# Altium footprint library ESKDPcbLib.PcbLib: 608 footprints (part 28 of 38)
Each footprint in its own frame and in the unit in brackets; x right, y up, seen from the top. Pads: shape width x height; smd on the part's side, far side on the other; paste and mask are expansions set on the pad; w line width, h text height; cw(c..) or ccw(c..) is an arc to the next point about the centre after c.
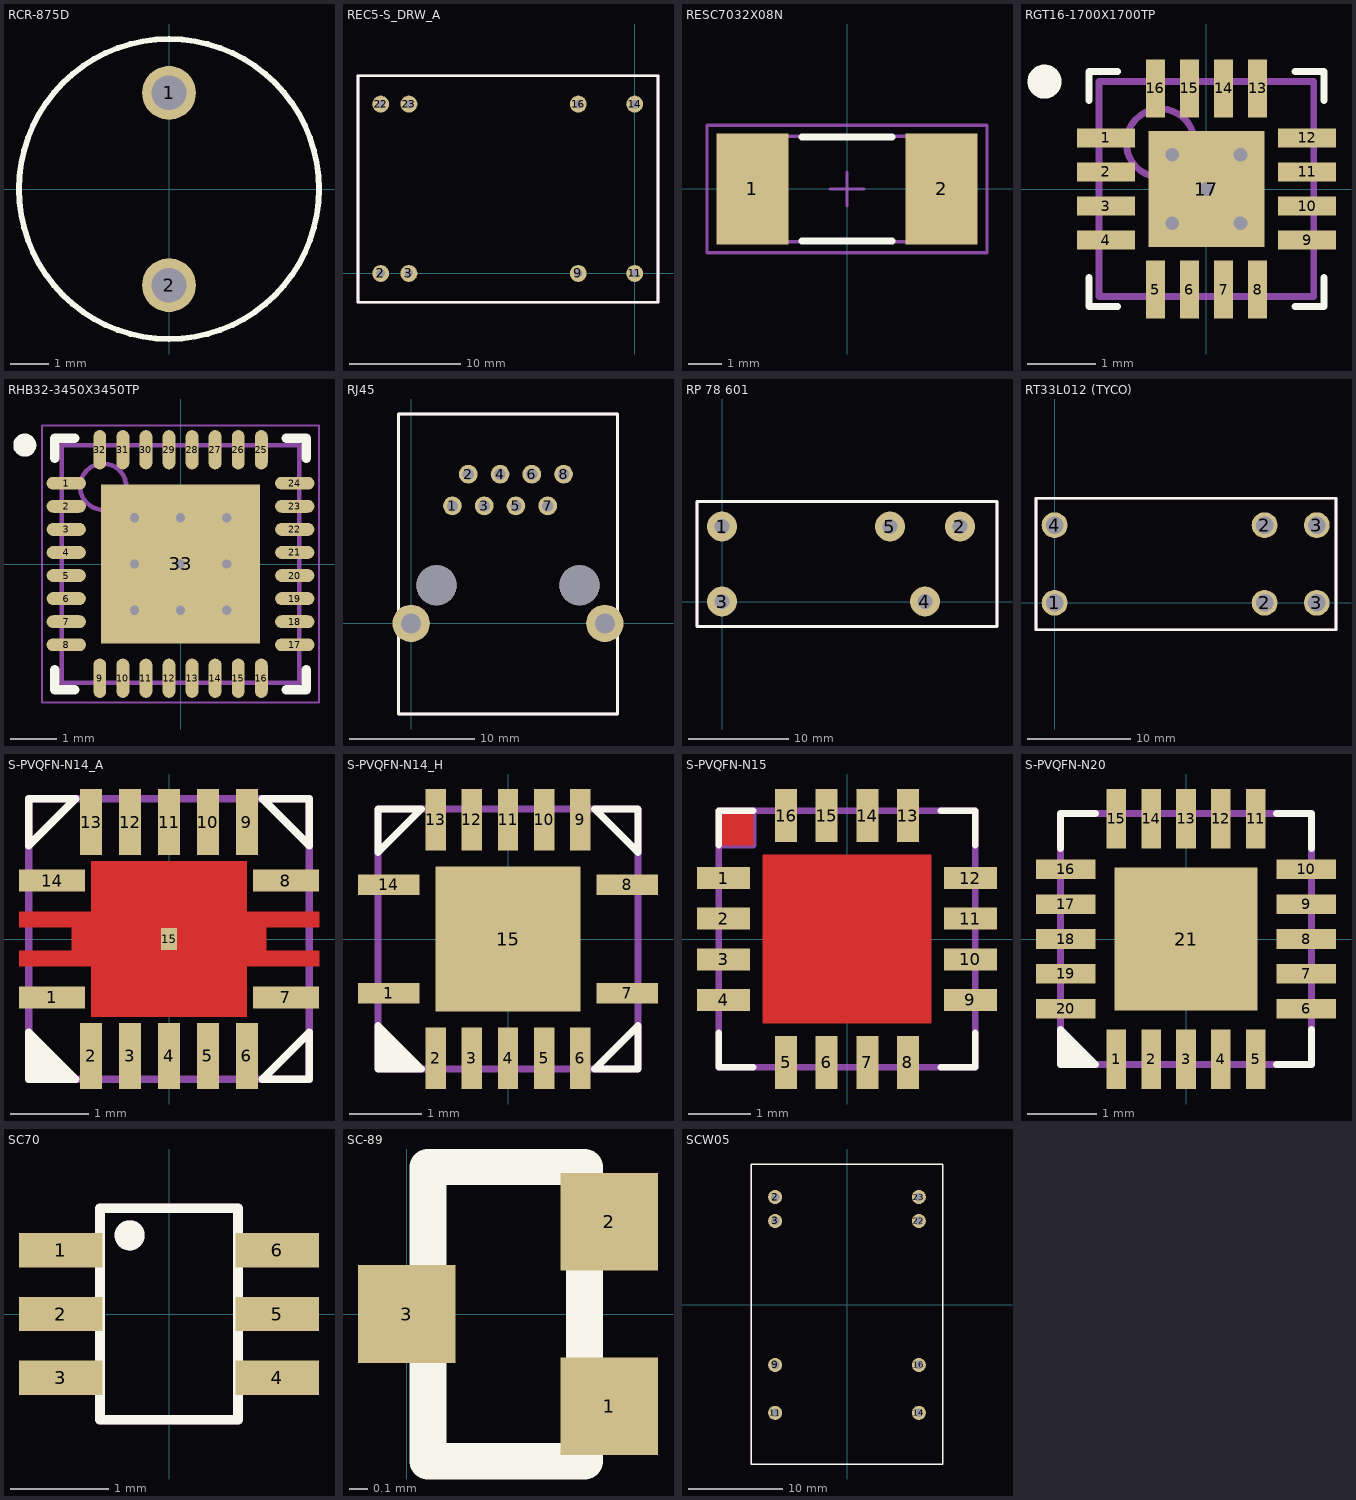
[diagram p27: the footprints below, top view; thin cyan lines are the x and y axes]

## RCR-875D [mm]
height 7.5
pads (2):
  round 1.4 hole 0.9: 1(0,2.5) 2(0,-2.5)
Top Overlay:
  circle w0.15: c0,0 r3.9
Mechanical 7:
  circle w0.1: c0,0 r3.9
Mechanical 10:
  text ".Comment" at -1.245,4.335 h0.6
  text ".Designator" at -1.255,4.905 h0.8
3D body: height 7.5, standoff 0, extent -3.869,-3.892 3.9,3.892

## REC5-S_DRW_A [mil]
height 401.57
pads (8):
  round 60 hole 30: 2(-900,0) 3(-800,0) 9(-200,0) 11(0,0) 14(0,600) 16(-200,600) 22(-900,600) 23(-800,600)
Top Overlay:
  lines w10: -980.32,-102.36 -980.32,700.79 82.68,700.79 82.68,-70.87 82.68,-102.36 -980.32,-102.36
Mechanical 7:
  lines w10: -980.32,-102.36 82.68,-102.36 82.68,-70.87 82.68,700.79 -980.32,700.79 -980.32,-102.36
Mechanical 10:
  text ".Designator" at -59.06,767.72 h31.5
  text ".Comment" at -19.68,728.35 h23.62
3D body: height 401.57, standoff 0, extent -980.32,-102.36 82.68,700.79

## RESC7032X08N [mm] "Chip Resistor, 2-Leads, Body 7,0x3,2mm, IPC Medium Density"
height 0.83
pads (2):
  rect 2.15x3.3 smd: 1(-2.825,0) 2(2.825,0)
Top Overlay:
  lines w0.2: -1.35,-1.55 1.35,-1.55 ; -1.35,1.55 1.35,1.55
Mechanical 9:
  lines w0.1: -3.505,-1.575 3.505,-1.575 3.505,1.575 -3.505,1.575 -3.505,-1.575
Mechanical 15:
  lines w0.1: -0.5,0 0.5,0 ; 0,-0.5 0,0.5 ; -4.175,-1.9 4.175,-1.9 4.175,1.9 -4.175,1.9 -4.175,-1.9
3D body: height 0.83, standoff 0, extent -3.505,-1.575 3.505,1.575

## RGT16-1700X1700TP [mm] "QFN, 16-Leads, Body 3x3mm, Pitch 0.5mm, Thermal Pad 1.7x1.7mm, TI Recommended"
height 1
pads (17):
  rect 0.85x0.28 smd paste-0.025 mask+0.07: 1(-1.475,0.75) 2(-1.475,0.25) 3(-1.475,-0.25) 4(-1.475,-0.75) 9(1.475,-0.75) 10(1.475,-0.25) 11(1.475,0.25) 12(1.475,0.75)
  rect 0.28x0.85 smd paste-0.025 mask+0.07: 5(-0.75,-1.475) 6(-0.25,-1.475) 7(0.25,-1.475) 8(0.75,-1.475) 13(0.75,1.475) 14(0.25,1.475) 15(-0.25,1.475) 16(-0.75,1.475)
  rect 1.7x1.7 smd paste-0.85 mask+0.07: 17(0,0)
via 0,0 diameter 0.5 hole 0.2
via 0.5,0.5 diameter 0.5 hole 0.2
via 0.5,-0.5 diameter 0.5 hole 0.2
via -0.5,-0.5 diameter 0.5 hole 0.2
via -0.5,0.5 diameter 0.5 hole 0.2
Top Overlay:
  circle w0.25: c-2.375,1.575 r0.125
  lines w0.1: -1.725,-1.3 -1.725,-1.725 -1.3,-1.725 ; -1.725,1.3 -1.725,1.725 -1.3,1.725 ; 1.3,-1.725 1.725,-1.725 1.725,-1.3 ; 1.3,1.725 1.725,1.725 1.725,1.3
Top Paste:
  rectangle: 0.1,0.1 0.8,0.8
  region: 0.1,-0.1 0.1,-0.8 0.8,-0.8 0.8,-0.1
  region: -0.1,-0.1 -0.8,-0.1 -0.8,-0.8 -0.1,-0.8
  region: -0.1,0.1 -0.1,0.8 -0.8,0.8 -0.8,0.1
Mechanical 7:
  lines w0.05: -1.575,-1.575 1.575,-1.575 1.575,1.575 -1.575,1.575 -1.575,-1.575
  lines w0.1: -0.5,0 0.5,0 ; 0,-0.5 0,0.5
Mechanical 9:
  circle w0.1: c-0.675,0.675 r0.5
  lines w0.1: -1.575,-1.575 1.575,-1.575 1.575,1.575 -1.575,1.575 -1.575,-1.575
Mechanical 10:
  text ".Designator" at -1.1,-2.65 h0.7
  text ".Comment" at -0.725,2.65 h0.7
3D body: height 1, standoff 0, extent -1.575,-1.575 1.575,1.575

## RHB32-3450X3450TP [mm] "QFN, 32-Leads, Body 5x5mm, Pitch 0.5mm, Thermal Pad 3.45x3.45mm, TI Recommended"
height 1
pads (33):
  oval 0.85x0.28 smd paste-0.025 mask+0.07: 1(-2.475,1.75) 2(-2.475,1.25) 3(-2.475,0.75) 4(-2.475,0.25) 5(-2.475,-0.25) 6(-2.475,-0.75) 7(-2.475,-1.25) 8(-2.475,-1.75) 17(2.475,-1.75) 18(2.475,-1.25) 19(2.475,-0.75) 20(2.475,-0.25) 21(2.475,0.25) 22(2.475,0.75) 23(2.475,1.25) 24(2.475,1.75)
  oval 0.28x0.85 smd paste-0.025 mask+0.07: 9(-1.75,-2.475) 10(-1.25,-2.475) 11(-0.75,-2.475) 12(-0.25,-2.475) 13(0.25,-2.475) 14(0.75,-2.475) 15(1.25,-2.475) 16(1.75,-2.475) 25(1.75,2.475) 26(1.25,2.475) 27(0.75,2.475) 28(0.25,2.475) 29(-0.25,2.475) 30(-0.75,2.475) 31(-1.25,2.475) 32(-1.75,2.475)
  rect 3.45x3.45 smd paste-1.725 mask+0.07: 33(0,0)
via -1,1 diameter 0.5 hole 0.2
via 0,1 diameter 0.5 hole 0.2
via 1,1 diameter 0.5 hole 0.2
via -1,0 diameter 0.5 hole 0.2
via 0,0 diameter 0.5 hole 0.2
via 1,0 diameter 0.5 hole 0.2
via -1,-1 diameter 0.5 hole 0.2
via 0,-1 diameter 0.5 hole 0.2
via 1,-1 diameter 0.5 hole 0.2
Top Overlay:
  circle w0.25: c-3.375,2.575 r0.125
  lines w0.2: -2.725,-2.29 -2.725,-2.725 -2.29,-2.725 ; -2.725,2.29 -2.725,2.725 -2.29,2.725 ; 2.29,-2.725 2.725,-2.725 2.725,-2.29 ; 2.29,2.725 2.725,2.725 2.725,2.29
Top Paste:
  region: -0.15,1.6 -1.6,1.6 -1.6,0.15 -0.15,0.15
  rectangle: 0.15,0.15 1.6,1.6
  rectangle: 0.15,-1.6 1.6,-0.15
  region: -0.15,-0.15 -1.6,-0.15 -1.6,-1.6 -0.15,-1.6
Mechanical 13:
  circle w0.1: c-1.675,1.675 r0.5
  lines w0.1: -2.575,-2.575 -2.575,2.575 2.575,2.575 2.575,-2.575 -2.575,-2.575
Mechanical 15:
  lines w0.05: -3,-3 -3,3 3,3 3,-3 -3,-3
  lines w0.1: -0.5,0 0.5,0 ; 0,-0.5 0,0.5
3D body: height 1, standoff 0, extent -2.575,-2.575 2.575,2.575

## RJ45 [mm]
pads (12):
  round 1.5 hole 0.9: 1(3.305,9.4) 2(4.575,11.94) 3(5.845,9.4) 4(7.115,11.94) 5(8.385,9.4) 6(9.655,11.94) 7(10.925,9.4) 8(12.195,11.94)
  round 3 hole 1.6: ""(0,0) ""(15.5,0)
  round 3.2 hole 3.2 unplated: ""(2.035,3.05) ""(13.465,3.05)
Top Overlay:
  lines w0.254: -1,-7.25 -1,16.75 16.5,16.75 16.5,-7.25 -1,-7.25
Bottom Overlay:
  text "8" at 12,13 h1.52
  text "1" at 3,7.25 h1.52
Mechanical 7:
  lines w0.254: -1,-7.25 -1,16.75 16.5,16.75 16.5,-7.25 -1,-7.25
Mechanical 10:
  text ".Comment" at -1,17.5 h1
  text ".Designator" at -1,18.25 h1
3D body "SW3dPS-RJ45-8P-Pipe-Cat5e.STEP": height 14.55, standoff -3.6, extent -1,-7.25 16.6,16.75

## RP 78 601 [mm]
pads (5):
  round 3 hole 1.5: 1(0,7.5) 2(23.8,7.5) 3(0,0) 4(20.3,0) 5(16.8,7.5)
Top Overlay:
  lines w0.254: -2.5,-2.5 27.5,-2.5 27.5,10 -2.5,10 -2.5,-2.5
Mechanical 7:
  lines w0.254: -2.5,-2.5 27.5,-2.5 27.5,10 -2.5,10 -2.5,-2.5
Mechanical 10:
  text ".Designator" at 17.5,12.5 h1.52
  text ".Comment" at 17.5,15 h1.52

## RT33L012 (TYCO) [mm]
pads (6):
  round 2.5 hole 1.7 mask+0: 1(0,0) 2(20.3,0) 2(20.3,7.5) 3(25.34,0) 3(25.34,7.5) 4(0,7.5)
Top Overlay:
  lines w0.254: -1.8,-2.6 27.2,-2.6 27.2,10.1 -1.8,10.1 -1.8,-2.6
Mechanical 7:
  lines w0.254: -1.8,-2.6 -1.8,10.1 27.2,10.1 27.2,-2.6 -1.8,-2.6
3D body: height 15.7, standoff 0, extent -1.8,-2.6 27.2,10.1

## S-PVQFN-N14_A [mm]
height 1
pads (15):
  rect 0.85x0.28 smd mask+0: 1(-1.5,-0.75) 7(1.5,-0.75) 8(1.5,0.75) 14(-1.5,0.75)
  rect 0.28x0.85 smd mask+0: 2(-1,-1.5) 3(-0.5,-1.5) 4(0,-1.5) 5(0.5,-1.5) 6(1,-1.5) 9(1,1.5) 10(0.5,1.5) 11(0,1.5) 12(-0.5,1.5) 13(-1,1.5)
  rect 0.2x0.28 smd mask+0: 15(0,0)
Top Layer:
  region: 1,-1 1,-0.35 1.925,-0.35 1.925,-0.15 1.25,-0.15 1.25,0.15 1.925,0.15 1.925,0.35 1,0.35 1,1 -1,1 -1,0.35 -1.925,0.35 -1.925,0.15 -1.25,0.15 -1.25,-0.15 -1.925,-0.15 -1.925,-0.35 -1,-0.35 -1,-1
Top Overlay:
  region: -1.8,-1.2 -1.8,-1.8 -1.2,-1.8
  lines w0.1: -1.8,-1.8 -1.2,-1.8 -1.8,-1.2 -1.8,-1.8 ; -1.8,1.2 -1.2,1.8 -1.8,1.8 -1.8,1.2 ; 1.2,-1.8 1.8,-1.2 1.8,-1.8 1.2,-1.8 ; 1.2,1.8 1.8,1.2 1.8,1.8 1.2,1.8
Mechanical 7:
  lines w0.1: -1.8,-1.8 -1.8,1.8 1.8,1.8 1.8,-1.8 -1.8,-1.8
Mechanical 10:
  text ".Comment" at -1.5,-2.4 h0.6
  text ".Designator" at -1.6,2.1 h0.8
3D body: height 1, standoff 0, extent -1.8,-1.8 1.8,1.8

## S-PVQFN-N14_H [mm]
height 1
pads (15):
  rect 0.85x0.28 smd mask+0: 1(-1.65,-0.75) 7(1.65,-0.75) 8(1.65,0.75) 14(-1.65,0.75)
  rect 0.28x0.85 smd mask+0: 2(-1,-1.65) 3(-0.5,-1.65) 4(0,-1.65) 5(0.5,-1.65) 6(1,-1.65) 9(1,1.65) 10(0.5,1.65) 11(0,1.65) 12(-0.5,1.65) 13(-1,1.65)
  rect 2x2 smd mask+0: 15(0,0)
Top Overlay:
  region: -1.8,-1.2 -1.8,-1.8 -1.2,-1.8
  lines w0.1: -1.8,-1.8 -1.2,-1.8 -1.8,-1.2 -1.8,-1.8 ; -1.8,1.2 -1.2,1.8 -1.8,1.8 -1.8,1.2 ; 1.2,-1.8 1.8,-1.2 1.8,-1.8 1.2,-1.8 ; 1.2,1.8 1.8,1.2 1.8,1.8 1.2,1.8
Mechanical 7:
  lines w0.1: -1.8,-1.8 -1.8,1.8 1.8,1.8 1.8,-1.8 -1.8,-1.8
Mechanical 10:
  text ".Comment" at -1.55,-2.875 h0.6
  text ".Designator" at -1.6,2.4 h0.8
3D body: height 1, standoff 0, extent -1.8,-1.8 1.8,1.8

## S-PVQFN-N15 [mm]
pads (16):
  rect 0.85x0.35 smd mask+0: 1(-1.975,0.975) 2(-1.975,0.325) 3(-1.975,-0.325) 4(-1.975,-0.975) 9(1.975,-0.975) 10(1.975,-0.325) 11(1.975,0.325) 12(1.975,0.975)
  rect 0.35x0.85 smd mask+0: 5(-0.975,-1.975) 6(-0.325,-1.975) 7(0.325,-1.975) 8(0.975,-1.975) 13(0.975,1.975) 14(0.325,1.975) 15(-0.325,1.975) 16(-0.975,1.975)
Top Layer:
  region: -2,2 -2,1.5 -1.5,1.5 -1.5,2
  region: -1.35,1.35 1.35,1.35 1.35,-1.35 -1.35,-1.35
Top Overlay:
  lines w0.1: -2.05,-1.5 -2.05,-2.05 -1.5,-2.05 ; -2.05,1.5 -2.05,2.05 -1.5,2.05 ; 1.5,-2.05 2.05,-2.05 2.05,-1.5 ; 1.5,2.05 2.05,2.05 2.05,1.5
Mechanical 7:
  rectangle: -2.05,1.5 -1.5,2.05
  lines w0.1: -2.05,1.5 -1.5,1.5 -1.5,2.05 ; -2.05,-2.05 -2.05,2.05 2.05,2.05 2.05,-2.05 -2.05,-2.05
Mechanical 10:
  text ".Comment" at -2.2,-3 h0.6
  text ".Designator" at -0.95,2.7 h0.8
3D body: height 1, standoff 0, extent -2,-2 2,2

## S-PVQFN-N20 [mm]
pads (21):
  rect 0.28x0.85 smd mask+0: 1(-1,-1.725) 2(-0.5,-1.725) 3(0,-1.725) 4(0.5,-1.725) 5(1,-1.725) 11(1,1.725) 12(0.5,1.725) 13(0,1.725) 14(-0.5,1.725) 15(-1,1.725)
  rect 0.85x0.28 smd mask+0: 6(1.725,-1) 7(1.725,-0.5) 8(1.725,0) 9(1.725,0.5) 10(1.725,1) 16(-1.725,1) 17(-1.725,0.5) 18(-1.725,0) 19(-1.725,-0.5) 20(-1.725,-1)
  rect 2.05x2.05 smd mask+0: 21(0,0)
Top Overlay:
  region: -1.8,-1.3 -1.8,-1.8 -1.3,-1.8
  lines w0.1: -1.8,1.3 -1.8,1.8 -1.3,1.8 ; 1.3,-1.8 1.8,-1.8 1.8,-1.3 ; 1.3,1.8 1.8,1.8 1.8,1.3 ; -1.8,-1.8 -1.3,-1.8 -1.8,-1.3 -1.8,-1.8
Mechanical 7:
  lines w0.1: -1.8,-1.8 -1.8,1.8 1.8,1.8 1.8,-1.8 -1.8,-1.8
3D body: height 1, standoff 0, extent -1.8,-1.8 1.8,1.8

## SC70 [mm]
pads (6):
  rect 0.85x0.35 smd: 1(-1.1,0.65) 2(-1.1,0) 3(-1.1,-0.65) 4(1.1,-0.65) 5(1.1,0) 6(1.1,0.65)
Top Overlay:
  circle w0.254: c-0.4,0.8 r0.025
  lines w0.1: -0.7,-1.075 0.7,-1.075 0.7,1.075 -0.7,1.075 -0.7,-1.075
Mechanical 7:
  circle w0.254: c-0.4,0.8 r0.025
  lines w0.1: -0.7,-1.075 0.7,-1.075 0.7,1.075 -0.7,1.075 -0.7,-1.075
Mechanical 10:
  text ".Comment" at -0.4,2.55 h1.5
  text ".Designator" at -0.8,1.325 h1.5
3D body: height 1.1, standoff 0.1, extent -0.7,-1.075 0.7,1.075

## SC-75 [mm]

## SC-89 [mm]
pads (3):
  rect 0.53x0.53 smd: 1(1.1,-0.5) 2(1.1,0.5) 3(0,0)
Top Overlay:
  lines w0.2: 0.115,-0.8 0.965,-0.8 0.965,0.8 0.115,0.8 0.115,-0.8

## SCW05 [mm]
height 12.2
pads (8):
  round 1.5 hole 0.9: 2(-7.62,11.44) 3(-7.62,8.9) 9(-7.62,-6.36) 11(-7.62,-11.44) 14(7.62,-11.44) 16(7.62,-6.36) 22(7.62,8.9) 23(7.62,11.44)
Top Overlay:
  lines w0.15: -10.15,-16.86 -10.15,14.94 10.15,14.94 10.15,-16.86 -10.15,-16.86
Mechanical 7:
  lines w0.1: -10.15,-16.86 10.15,-16.86 10.15,14.94 -10.15,14.94 -10.15,-16.86
Mechanical 10:
  text ".Comment" at -1.075,-0.675 h0.6
  text ".Designator" at -1.15,0.45 h0.8
3D body: height 12.2, standoff 0, extent -10.15,-16.86 10.15,14.94